# Altium footprint library Connector_PinHeader_2.54mm.PcbLib: 278 footprints (part 2 of 18)
Each footprint in its own frame and in the unit in brackets; x right, y up, seen from the top. Pads: shape width x height; smd on the part's side, far side on the other; paste and mask are expansions set on the pad; w line width, h text height; cw(c..) or ccw(c..) is an arc to the next point about the centre after c.
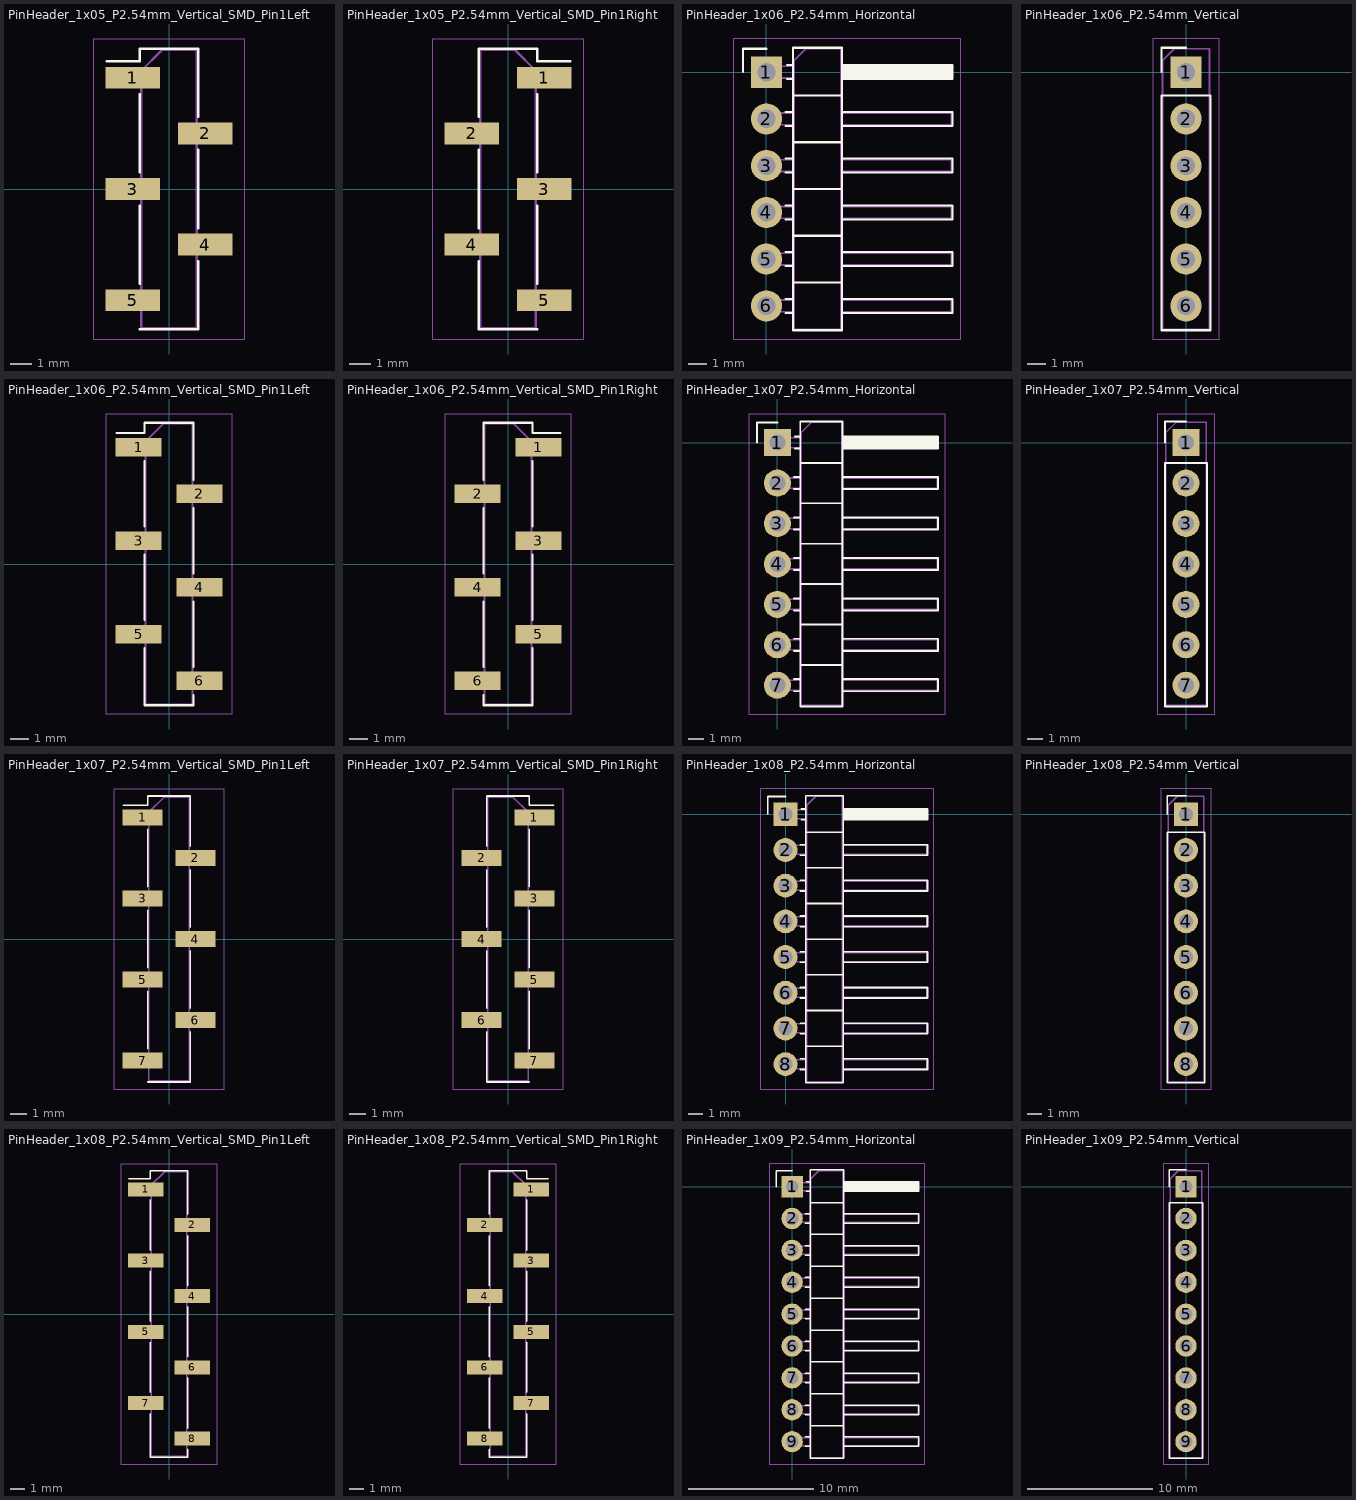
[diagram p1: the footprints below, top view; thin cyan lines are the x and y axes]

## PinHeader_1x05_P2.54mm_Vertical_SMD_Pin1Left [mm]
pads (5):
  rect 2.51x1 smd: 1(-1.655,5.08) 2(1.655,2.54) 3(-1.655,0) 4(1.655,-2.54) 5(-1.655,-5.08)
F.SilkS:
  lines w0.12: -2.85,5.84 -1.33,5.84 -1.33,6.41 1.33,6.41 1.33,3.3 ; -1.33,-6.41 1.33,-6.41 ; -1.33,-4.32 -1.33,-0.76 ; -1.33,0.76 -1.33,4.32 ; 1.33,-5.84 1.33,-6.41 ; 1.33,-3.3 1.33,-6.41 ; 1.33,-1.78 1.33,1.78
F.CrtYd:
  lines w0.05: -3.45,-6.85 -3.45,6.85 3.45,6.85 3.45,-6.85 -3.45,-6.85
F.Fab:
  lines w0.1: -1.27,-5.4 -2.54,-5.4 -2.54,-4.76 -1.27,-4.76 ; -1.27,-0.32 -2.54,-0.32 -2.54,0.32 -1.27,0.32 ; -1.27,4.76 -2.54,4.76 -2.54,5.4 -1.27,5.4 ; 1.27,-2.86 2.54,-2.86 2.54,-2.22 1.27,-2.22 ; 1.27,2.22 2.54,2.22 2.54,2.86 1.27,2.86 ; -1.27,5.4 -0.32,6.35 1.27,6.35 1.27,-6.35 -1.27,-6.35 -1.27,5.4
  text "'.Designator'" at 0.84,-4.047 h1

## PinHeader_1x05_P2.54mm_Vertical_SMD_Pin1Right [mm]
pads (5):
  rect 2.51x1 smd: 1(1.655,5.08) 2(-1.655,2.54) 3(1.655,0) 4(-1.655,-2.54) 5(1.655,-5.08)
F.SilkS:
  lines w0.12: -1.33,-5.84 -1.33,-6.41 ; -1.33,-3.3 -1.33,-6.41 ; -1.33,-1.78 -1.33,1.78 ; -1.33,3.3 -1.33,6.41 1.33,6.41 1.33,5.84 2.85,5.84 ; 1.33,-6.41 -1.33,-6.41 ; 1.33,-4.32 1.33,-0.76 ; 1.33,0.76 1.33,4.32
F.CrtYd:
  lines w0.05: -3.45,-6.85 3.45,-6.85 3.45,6.85 -3.45,6.85 -3.45,-6.85
F.Fab:
  lines w0.1: -1.27,-2.86 -2.54,-2.86 -2.54,-2.22 -1.27,-2.22 ; -1.27,2.22 -2.54,2.22 -2.54,2.86 -1.27,2.86 ; 1.27,-5.4 2.54,-5.4 2.54,-4.76 1.27,-4.76 ; 1.27,-0.32 2.54,-0.32 2.54,0.32 1.27,0.32 ; 1.27,4.76 2.54,4.76 2.54,5.4 1.27,5.4 ; 1.27,5.4 0.32,6.35 -1.27,6.35 -1.27,-6.35 1.27,-6.35 1.27,5.4
  text "'.Designator'" at 0.84,-4.047 h1

## PinHeader_1x06_P2.54mm_Horizontal [mm]
pads (6):
  rect 1.7x1.7 hole 1: 1(0,0)
  rrect100% 1.7x1.7 hole 1: 2(0,-2.54) 3(0,-5.08) 4(0,-7.62) 5(0,-10.16) 6(0,-12.7)
F.SilkS:
  lines w0.12: -1.27,0 -1.27,1.27 0,1.27 ; 1.043,-13.08 1.44,-13.08 ; 1.043,-12.32 1.44,-12.32 ; 1.043,-10.54 1.44,-10.54 ; 1.043,-9.78 1.44,-9.78 ; 1.043,-8 1.44,-8 ; 1.043,-7.24 1.44,-7.24 ; 1.043,-5.46 1.44,-5.46 ; 1.043,-4.7 1.44,-4.7 ; 1.043,-2.92 1.44,-2.92 ; 1.043,-2.16 1.44,-2.16 ; 1.11,-0.38 1.44,-0.38 ; 1.11,0.38 1.44,0.38 ; 1.44,-11.43 4.1,-11.43 ; 1.44,-8.89 4.1,-8.89 ; 1.44,-6.35 4.1,-6.35 ; 1.44,-3.81 4.1,-3.81 ; 1.44,-1.27 4.1,-1.27 ; 4.1,-13.08 10.1,-13.08 10.1,-12.32 4.1,-12.32 ; 4.1,-10.54 10.1,-10.54 10.1,-9.78 4.1,-9.78 ; 4.1,-8 10.1,-8 10.1,-7.24 4.1,-7.24 ; 4.1,-5.46 10.1,-5.46 10.1,-4.7 4.1,-4.7 ; 4.1,-2.92 10.1,-2.92 10.1,-2.16 4.1,-2.16 ; 4.1,-0.38 10.1,-0.38 10.1,0.38 4.1,0.38 ; 4.1,-0.28 10.1,-0.28 ; 4.1,-0.16 10.1,-0.16 ; 4.1,-0.04 10.1,-0.04 ; 4.1,0.08 10.1,0.08 ; 4.1,0.2 10.1,0.2 ; 4.1,0.32 10.1,0.32 ; 1.44,-14.03 1.44,1.33 4.1,1.33 4.1,-14.03 1.44,-14.03
F.CrtYd:
  lines w0.05: -1.8,-14.5 -1.8,1.8 10.55,1.8 10.55,-14.5 -1.8,-14.5
F.Fab:
  lines w0.1: 1.5,-13.02 -0.32,-13.02 -0.32,-12.38 1.5,-12.38 ; 1.5,-10.48 -0.32,-10.48 -0.32,-9.84 1.5,-9.84 ; 1.5,-7.94 -0.32,-7.94 -0.32,-7.3 1.5,-7.3 ; 1.5,-5.4 -0.32,-5.4 -0.32,-4.76 1.5,-4.76 ; 1.5,-2.86 -0.32,-2.86 -0.32,-2.22 1.5,-2.22 ; 1.5,-0.32 -0.32,-0.32 -0.32,0.32 1.5,0.32 ; 4.04,-13.02 10.04,-13.02 10.04,-12.38 4.04,-12.38 ; 4.04,-10.48 10.04,-10.48 10.04,-9.84 4.04,-9.84 ; 4.04,-7.94 10.04,-7.94 10.04,-7.3 4.04,-7.3 ; 4.04,-5.4 10.04,-5.4 10.04,-4.76 4.04,-4.76 ; 4.04,-2.86 10.04,-2.86 10.04,-2.22 4.04,-2.22 ; 4.04,-0.32 10.04,-0.32 10.04,0.32 4.04,0.32 ; 1.5,-13.97 4.04,-13.97 4.04,1.27 2.135,1.27 1.5,0.635 1.5,-13.97
  text "'.Designator'" at 3.61,-10.397 h1

## PinHeader_1x06_P2.54mm_Vertical [mm]
pads (6):
  rect 1.7x1.7 hole 1: 1(0,0)
  rrect100% 1.7x1.7 hole 1: 2(0,-2.54) 3(0,-5.08) 4(0,-7.62) 5(0,-10.16) 6(0,-12.7)
F.SilkS:
  lines w0.12: -1.33,0 -1.33,1.33 0,1.33 ; -1.33,-14.03 -1.33,-1.27 1.33,-1.27 1.33,-14.03 -1.33,-14.03
F.CrtYd:
  lines w0.05: -1.8,-14.5 1.8,-14.5 1.8,1.8 -1.8,1.8 -1.8,-14.5
F.Fab:
  lines w0.1: -1.27,-13.97 1.27,-13.97 1.27,1.27 -0.635,1.27 -1.27,0.635 -1.27,-13.97
  text "'.Designator'" at 0.84,-10.397 h1

## PinHeader_1x06_P2.54mm_Vertical_SMD_Pin1Left [mm]
pads (6):
  rect 2.51x1 smd: 1(-1.655,6.35) 2(1.655,3.81) 3(-1.655,1.27) 4(1.655,-1.27) 5(-1.655,-3.81) 6(1.655,-6.35)
F.SilkS:
  lines w0.12: -2.85,7.11 -1.33,7.11 -1.33,7.68 1.33,7.68 1.33,4.57 ; -1.33,-4.57 -1.33,-7.68 1.33,-7.68 1.33,-7.11 ; -1.33,-3.05 -1.33,0.51 ; -1.33,2.03 -1.33,5.59 ; 1.33,-5.59 1.33,-2.03 ; 1.33,-0.51 1.33,3.05
F.CrtYd:
  lines w0.05: -3.45,-8.15 3.45,-8.15 3.45,8.15 -3.45,8.15 -3.45,-8.15
F.Fab:
  lines w0.1: -1.27,-4.13 -2.54,-4.13 -2.54,-3.49 -1.27,-3.49 ; -1.27,0.95 -2.54,0.95 -2.54,1.59 -1.27,1.59 ; -1.27,6.03 -2.54,6.03 -2.54,6.67 -1.27,6.67 ; 1.27,-6.67 2.54,-6.67 2.54,-6.03 1.27,-6.03 ; 1.27,-1.59 2.54,-1.59 2.54,-0.95 1.27,-0.95 ; 1.27,3.49 2.54,3.49 2.54,4.13 1.27,4.13 ; -1.27,6.67 -1.27,-7.62 1.27,-7.62 1.27,7.62 -0.32,7.62 -1.27,6.67
  text "'.Designator'" at 0.84,-4.047 h1

## PinHeader_1x06_P2.54mm_Vertical_SMD_Pin1Right [mm]
pads (6):
  rect 2.51x1 smd: 1(1.655,6.35) 2(-1.655,3.81) 3(1.655,1.27) 4(-1.655,-1.27) 5(1.655,-3.81) 6(-1.655,-6.35)
F.SilkS:
  lines w0.12: -1.33,-7.11 -1.33,-7.68 1.33,-7.68 1.33,-4.57 ; -1.33,-5.59 -1.33,-2.03 ; -1.33,-0.51 -1.33,3.05 ; -1.33,4.57 -1.33,7.68 1.33,7.68 1.33,7.11 2.85,7.11 ; 1.33,-3.05 1.33,0.51 ; 1.33,2.03 1.33,5.59
F.CrtYd:
  lines w0.05: -3.45,-8.15 -3.45,8.15 3.45,8.15 3.45,-8.15 -3.45,-8.15
F.Fab:
  lines w0.1: -1.27,-6.67 -2.54,-6.67 -2.54,-6.03 -1.27,-6.03 ; -1.27,-1.59 -2.54,-1.59 -2.54,-0.95 -1.27,-0.95 ; -1.27,3.49 -2.54,3.49 -2.54,4.13 -1.27,4.13 ; 1.27,-4.13 2.54,-4.13 2.54,-3.49 1.27,-3.49 ; 1.27,0.95 2.54,0.95 2.54,1.59 1.27,1.59 ; 1.27,6.03 2.54,6.03 2.54,6.67 1.27,6.67 ; 1.27,6.67 1.27,-7.62 -1.27,-7.62 -1.27,7.62 0.32,7.62 1.27,6.67
  text "'.Designator'" at 0.84,-4.047 h1

## PinHeader_1x07_P2.54mm_Horizontal [mm]
pads (7):
  rect 1.7x1.7 hole 1: 1(0,0)
  rrect100% 1.7x1.7 hole 1: 2(0,-2.54) 3(0,-5.08) 4(0,-7.62) 5(0,-10.16) 6(0,-12.7) 7(0,-15.24)
F.SilkS:
  lines w0.12: -1.27,0 -1.27,1.27 0,1.27 ; 1.043,-15.62 1.44,-15.62 ; 1.043,-14.86 1.44,-14.86 ; 1.043,-13.08 1.44,-13.08 ; 1.043,-12.32 1.44,-12.32 ; 1.043,-10.54 1.44,-10.54 ; 1.043,-9.78 1.44,-9.78 ; 1.043,-8 1.44,-8 ; 1.043,-7.24 1.44,-7.24 ; 1.043,-5.46 1.44,-5.46 ; 1.043,-4.7 1.44,-4.7 ; 1.043,-2.92 1.44,-2.92 ; 1.043,-2.16 1.44,-2.16 ; 1.11,-0.38 1.44,-0.38 ; 1.11,0.38 1.44,0.38 ; 1.44,-13.97 4.1,-13.97 ; 1.44,-11.43 4.1,-11.43 ; 1.44,-8.89 4.1,-8.89 ; 1.44,-6.35 4.1,-6.35 ; 1.44,-3.81 4.1,-3.81 ; 1.44,-1.27 4.1,-1.27 ; 4.1,-15.62 10.1,-15.62 10.1,-14.86 4.1,-14.86 ; 4.1,-13.08 10.1,-13.08 10.1,-12.32 4.1,-12.32 ; 4.1,-10.54 10.1,-10.54 10.1,-9.78 4.1,-9.78 ; 4.1,-8 10.1,-8 10.1,-7.24 4.1,-7.24 ; 4.1,-5.46 10.1,-5.46 10.1,-4.7 4.1,-4.7 ; 4.1,-2.92 10.1,-2.92 10.1,-2.16 4.1,-2.16 ; 4.1,-0.38 10.1,-0.38 10.1,0.38 4.1,0.38 ; 4.1,-0.28 10.1,-0.28 ; 4.1,-0.16 10.1,-0.16 ; 4.1,-0.04 10.1,-0.04 ; 4.1,0.08 10.1,0.08 ; 4.1,0.2 10.1,0.2 ; 4.1,0.32 10.1,0.32 ; 1.44,-16.57 1.44,1.33 4.1,1.33 4.1,-16.57 1.44,-16.57
F.CrtYd:
  lines w0.05: -1.8,-17.05 -1.8,1.8 10.55,1.8 10.55,-17.05 -1.8,-17.05
F.Fab:
  lines w0.1: 1.5,-15.56 -0.32,-15.56 -0.32,-14.92 1.5,-14.92 ; 1.5,-13.02 -0.32,-13.02 -0.32,-12.38 1.5,-12.38 ; 1.5,-10.48 -0.32,-10.48 -0.32,-9.84 1.5,-9.84 ; 1.5,-7.94 -0.32,-7.94 -0.32,-7.3 1.5,-7.3 ; 1.5,-5.4 -0.32,-5.4 -0.32,-4.76 1.5,-4.76 ; 1.5,-2.86 -0.32,-2.86 -0.32,-2.22 1.5,-2.22 ; 1.5,-0.32 -0.32,-0.32 -0.32,0.32 1.5,0.32 ; 4.04,-15.56 10.04,-15.56 10.04,-14.92 4.04,-14.92 ; 4.04,-13.02 10.04,-13.02 10.04,-12.38 4.04,-12.38 ; 4.04,-10.48 10.04,-10.48 10.04,-9.84 4.04,-9.84 ; 4.04,-7.94 10.04,-7.94 10.04,-7.3 4.04,-7.3 ; 4.04,-5.4 10.04,-5.4 10.04,-4.76 4.04,-4.76 ; 4.04,-2.86 10.04,-2.86 10.04,-2.22 4.04,-2.22 ; 4.04,-0.32 10.04,-0.32 10.04,0.32 4.04,0.32 ; 1.5,-16.51 1.5,0.635 2.135,1.27 4.04,1.27 4.04,-16.51 1.5,-16.51
  text "'.Designator'" at 3.61,-11.667 h1

## PinHeader_1x07_P2.54mm_Vertical [mm]
pads (7):
  rect 1.7x1.7 hole 1: 1(0,0)
  rrect100% 1.7x1.7 hole 1: 2(0,-2.54) 3(0,-5.08) 4(0,-7.62) 5(0,-10.16) 6(0,-12.7) 7(0,-15.24)
F.SilkS:
  lines w0.12: -1.33,0 -1.33,1.33 0,1.33 ; -1.33,-16.57 -1.33,-1.27 1.33,-1.27 1.33,-16.57 -1.33,-16.57
F.CrtYd:
  lines w0.05: -1.8,-17.05 1.8,-17.05 1.8,1.8 -1.8,1.8 -1.8,-17.05
F.Fab:
  lines w0.1: -1.27,-16.51 1.27,-16.51 1.27,1.27 -0.635,1.27 -1.27,0.635 -1.27,-16.51
  text "'.Designator'" at 0.84,-11.667 h1

## PinHeader_1x07_P2.54mm_Vertical_SMD_Pin1Left [mm]
pads (7):
  rect 2.51x1 smd: 1(-1.655,7.62) 2(1.655,5.08) 3(-1.655,2.54) 4(1.655,0) 5(-1.655,-2.54) 6(1.655,-5.08) 7(-1.655,-7.62)
F.SilkS:
  lines w0.12: -2.85,8.38 -1.33,8.38 -1.33,8.95 1.33,8.95 1.33,5.84 ; -1.33,-8.95 1.33,-8.95 ; -1.33,-6.86 -1.33,-3.3 ; -1.33,-1.78 -1.33,1.78 ; -1.33,3.3 -1.33,6.86 ; 1.33,-8.38 1.33,-8.95 ; 1.33,-5.84 1.33,-8.95 ; 1.33,-4.32 1.33,-0.76 ; 1.33,0.76 1.33,4.32
F.CrtYd:
  lines w0.05: -3.45,-9.4 -3.45,9.4 3.45,9.4 3.45,-9.4 -3.45,-9.4
F.Fab:
  lines w0.1: -1.27,-7.94 -2.54,-7.94 -2.54,-7.3 -1.27,-7.3 ; -1.27,-2.86 -2.54,-2.86 -2.54,-2.22 -1.27,-2.22 ; -1.27,2.22 -2.54,2.22 -2.54,2.86 -1.27,2.86 ; -1.27,7.3 -2.54,7.3 -2.54,7.94 -1.27,7.94 ; 1.27,-5.4 2.54,-5.4 2.54,-4.76 1.27,-4.76 ; 1.27,-0.32 2.54,-0.32 2.54,0.32 1.27,0.32 ; 1.27,4.76 2.54,4.76 2.54,5.4 1.27,5.4 ; -1.27,7.94 -1.27,-8.89 1.27,-8.89 1.27,8.89 -0.32,8.89 -1.27,7.94
  text "'.Designator'" at 0.84,-4.047 h1

## PinHeader_1x07_P2.54mm_Vertical_SMD_Pin1Right [mm]
pads (7):
  rect 2.51x1 smd: 1(1.655,7.62) 2(-1.655,5.08) 3(1.655,2.54) 4(-1.655,0) 5(1.655,-2.54) 6(-1.655,-5.08) 7(1.655,-7.62)
F.SilkS:
  lines w0.12: -1.33,-8.38 -1.33,-8.95 ; -1.33,-5.84 -1.33,-8.95 ; -1.33,-4.32 -1.33,-0.76 ; -1.33,0.76 -1.33,4.32 ; -1.33,5.84 -1.33,8.95 1.33,8.95 1.33,8.38 2.85,8.38 ; 1.33,-8.95 -1.33,-8.95 ; 1.33,-6.86 1.33,-3.3 ; 1.33,-1.78 1.33,1.78 ; 1.33,3.3 1.33,6.86
F.CrtYd:
  lines w0.05: -3.45,-9.4 3.45,-9.4 3.45,9.4 -3.45,9.4 -3.45,-9.4
F.Fab:
  lines w0.1: -1.27,-5.4 -2.54,-5.4 -2.54,-4.76 -1.27,-4.76 ; -1.27,-0.32 -2.54,-0.32 -2.54,0.32 -1.27,0.32 ; -1.27,4.76 -2.54,4.76 -2.54,5.4 -1.27,5.4 ; 1.27,-7.94 2.54,-7.94 2.54,-7.3 1.27,-7.3 ; 1.27,-2.86 2.54,-2.86 2.54,-2.22 1.27,-2.22 ; 1.27,2.22 2.54,2.22 2.54,2.86 1.27,2.86 ; 1.27,7.3 2.54,7.3 2.54,7.94 1.27,7.94 ; 1.27,7.94 1.27,-8.89 -1.27,-8.89 -1.27,8.89 0.32,8.89 1.27,7.94
  text "'.Designator'" at 0.84,-4.047 h1

## PinHeader_1x08_P2.54mm_Horizontal [mm]
pads (8):
  rect 1.7x1.7 hole 1: 1(0,0)
  rrect100% 1.7x1.7 hole 1: 2(0,-2.54) 3(0,-5.08) 4(0,-7.62) 5(0,-10.16) 6(0,-12.7) 7(0,-15.24) 8(0,-17.78)
F.SilkS:
  lines w0.12: -1.27,0 -1.27,1.27 0,1.27 ; 1.043,-18.16 1.44,-18.16 ; 1.043,-17.4 1.44,-17.4 ; 1.043,-15.62 1.44,-15.62 ; 1.043,-14.86 1.44,-14.86 ; 1.043,-13.08 1.44,-13.08 ; 1.043,-12.32 1.44,-12.32 ; 1.043,-10.54 1.44,-10.54 ; 1.043,-9.78 1.44,-9.78 ; 1.043,-8 1.44,-8 ; 1.043,-7.24 1.44,-7.24 ; 1.043,-5.46 1.44,-5.46 ; 1.043,-4.7 1.44,-4.7 ; 1.043,-2.92 1.44,-2.92 ; 1.043,-2.16 1.44,-2.16 ; 1.11,-0.38 1.44,-0.38 ; 1.11,0.38 1.44,0.38 ; 1.44,-16.51 4.1,-16.51 ; 1.44,-13.97 4.1,-13.97 ; 1.44,-11.43 4.1,-11.43 ; 1.44,-8.89 4.1,-8.89 ; 1.44,-6.35 4.1,-6.35 ; 1.44,-3.81 4.1,-3.81 ; 1.44,-1.27 4.1,-1.27 ; 4.1,-18.16 10.1,-18.16 10.1,-17.4 4.1,-17.4 ; 4.1,-15.62 10.1,-15.62 10.1,-14.86 4.1,-14.86 ; 4.1,-13.08 10.1,-13.08 10.1,-12.32 4.1,-12.32 ; 4.1,-10.54 10.1,-10.54 10.1,-9.78 4.1,-9.78 ; 4.1,-8 10.1,-8 10.1,-7.24 4.1,-7.24 ; 4.1,-5.46 10.1,-5.46 10.1,-4.7 4.1,-4.7 ; 4.1,-2.92 10.1,-2.92 10.1,-2.16 4.1,-2.16 ; 4.1,-0.38 10.1,-0.38 10.1,0.38 4.1,0.38 ; 4.1,-0.28 10.1,-0.28 ; 4.1,-0.16 10.1,-0.16 ; 4.1,-0.04 10.1,-0.04 ; 4.1,0.08 10.1,0.08 ; 4.1,0.2 10.1,0.2 ; 4.1,0.32 10.1,0.32 ; 1.44,-19.11 1.44,1.33 4.1,1.33 4.1,-19.11 1.44,-19.11
F.CrtYd:
  lines w0.05: -1.8,-19.55 -1.8,1.8 10.55,1.8 10.55,-19.55 -1.8,-19.55
F.Fab:
  lines w0.1: 1.5,-18.1 -0.32,-18.1 -0.32,-17.46 1.5,-17.46 ; 1.5,-15.56 -0.32,-15.56 -0.32,-14.92 1.5,-14.92 ; 1.5,-13.02 -0.32,-13.02 -0.32,-12.38 1.5,-12.38 ; 1.5,-10.48 -0.32,-10.48 -0.32,-9.84 1.5,-9.84 ; 1.5,-7.94 -0.32,-7.94 -0.32,-7.3 1.5,-7.3 ; 1.5,-5.4 -0.32,-5.4 -0.32,-4.76 1.5,-4.76 ; 1.5,-2.86 -0.32,-2.86 -0.32,-2.22 1.5,-2.22 ; 1.5,-0.32 -0.32,-0.32 -0.32,0.32 1.5,0.32 ; 4.04,-18.1 10.04,-18.1 10.04,-17.46 4.04,-17.46 ; 4.04,-15.56 10.04,-15.56 10.04,-14.92 4.04,-14.92 ; 4.04,-13.02 10.04,-13.02 10.04,-12.38 4.04,-12.38 ; 4.04,-10.48 10.04,-10.48 10.04,-9.84 4.04,-9.84 ; 4.04,-7.94 10.04,-7.94 10.04,-7.3 4.04,-7.3 ; 4.04,-5.4 10.04,-5.4 10.04,-4.76 4.04,-4.76 ; 4.04,-2.86 10.04,-2.86 10.04,-2.22 4.04,-2.22 ; 4.04,-0.32 10.04,-0.32 10.04,0.32 4.04,0.32 ; 1.5,-19.05 1.5,0.635 2.135,1.27 4.04,1.27 4.04,-19.05 1.5,-19.05
  text "'.Designator'" at 3.61,-12.937 h1

## PinHeader_1x08_P2.54mm_Vertical [mm]
pads (8):
  rect 1.7x1.7 hole 1: 1(0,0)
  rrect100% 1.7x1.7 hole 1: 2(0,-2.54) 3(0,-5.08) 4(0,-7.62) 5(0,-10.16) 6(0,-12.7) 7(0,-15.24) 8(0,-17.78)
F.SilkS:
  lines w0.12: -1.33,0 -1.33,1.33 0,1.33 ; -1.33,-19.11 1.33,-19.11 1.33,-1.27 -1.33,-1.27 -1.33,-19.11
F.CrtYd:
  lines w0.05: -1.8,-19.55 1.8,-19.55 1.8,1.8 -1.8,1.8 -1.8,-19.55
F.Fab:
  lines w0.1: -1.27,-19.05 1.27,-19.05 1.27,1.27 -0.635,1.27 -1.27,0.635 -1.27,-19.05
  text "'.Designator'" at 0.84,-12.937 h1

## PinHeader_1x08_P2.54mm_Vertical_SMD_Pin1Left [mm]
pads (8):
  rect 2.51x1 smd: 1(-1.655,8.89) 2(1.655,6.35) 3(-1.655,3.81) 4(1.655,1.27) 5(-1.655,-1.27) 6(1.655,-3.81) 7(-1.655,-6.35) 8(1.655,-8.89)
F.SilkS:
  lines w0.12: -2.85,9.65 -1.33,9.65 -1.33,10.22 1.33,10.22 1.33,7.11 ; -1.33,-7.11 -1.33,-10.22 1.33,-10.22 1.33,-9.65 ; -1.33,-5.59 -1.33,-2.03 ; -1.33,-0.51 -1.33,3.05 ; -1.33,4.57 -1.33,8.13 ; 1.33,-8.13 1.33,-4.57 ; 1.33,-3.05 1.33,0.51 ; 1.33,2.03 1.33,5.59
F.CrtYd:
  lines w0.05: -3.45,-10.7 3.45,-10.7 3.45,10.7 -3.45,10.7 -3.45,-10.7
F.Fab:
  lines w0.1: -1.27,-6.67 -2.54,-6.67 -2.54,-6.03 -1.27,-6.03 ; -1.27,-1.59 -2.54,-1.59 -2.54,-0.95 -1.27,-0.95 ; -1.27,3.49 -2.54,3.49 -2.54,4.13 -1.27,4.13 ; -1.27,8.57 -2.54,8.57 -2.54,9.21 -1.27,9.21 ; 1.27,-9.21 2.54,-9.21 2.54,-8.57 1.27,-8.57 ; 1.27,-4.13 2.54,-4.13 2.54,-3.49 1.27,-3.49 ; 1.27,0.95 2.54,0.95 2.54,1.59 1.27,1.59 ; 1.27,6.03 2.54,6.03 2.54,6.67 1.27,6.67 ; -1.27,9.21 -0.32,10.16 1.27,10.16 1.27,-10.16 -1.27,-10.16 -1.27,9.21
  text "'.Designator'" at 0.84,-4.047 h1

## PinHeader_1x08_P2.54mm_Vertical_SMD_Pin1Right [mm]
pads (8):
  rect 2.51x1 smd: 1(1.655,8.89) 2(-1.655,6.35) 3(1.655,3.81) 4(-1.655,1.27) 5(1.655,-1.27) 6(-1.655,-3.81) 7(1.655,-6.35) 8(-1.655,-8.89)
F.SilkS:
  lines w0.12: -1.33,-9.65 -1.33,-10.22 1.33,-10.22 1.33,-7.11 ; -1.33,-8.13 -1.33,-4.57 ; -1.33,-3.05 -1.33,0.51 ; -1.33,2.03 -1.33,5.59 ; -1.33,7.11 -1.33,10.22 1.33,10.22 1.33,9.65 2.85,9.65 ; 1.33,-5.59 1.33,-2.03 ; 1.33,-0.51 1.33,3.05 ; 1.33,4.57 1.33,8.13
F.CrtYd:
  lines w0.05: -3.45,-10.7 3.45,-10.7 3.45,10.7 -3.45,10.7 -3.45,-10.7
F.Fab:
  lines w0.1: -1.27,-9.21 -2.54,-9.21 -2.54,-8.57 -1.27,-8.57 ; -1.27,-4.13 -2.54,-4.13 -2.54,-3.49 -1.27,-3.49 ; -1.27,0.95 -2.54,0.95 -2.54,1.59 -1.27,1.59 ; -1.27,6.03 -2.54,6.03 -2.54,6.67 -1.27,6.67 ; 1.27,-6.67 2.54,-6.67 2.54,-6.03 1.27,-6.03 ; 1.27,-1.59 2.54,-1.59 2.54,-0.95 1.27,-0.95 ; 1.27,3.49 2.54,3.49 2.54,4.13 1.27,4.13 ; 1.27,8.57 2.54,8.57 2.54,9.21 1.27,9.21 ; 1.27,9.21 1.27,-10.16 -1.27,-10.16 -1.27,10.16 0.32,10.16 1.27,9.21
  text "'.Designator'" at 0.84,-4.047 h1

## PinHeader_1x09_P2.54mm_Horizontal [mm]
pads (9):
  rect 1.7x1.7 hole 1: 1(0,0)
  rrect100% 1.7x1.7 hole 1: 2(0,-2.54) 3(0,-5.08) 4(0,-7.62) 5(0,-10.16) 6(0,-12.7) 7(0,-15.24) 8(0,-17.78) 9(0,-20.32)
F.SilkS:
  lines w0.12: -1.27,0 -1.27,1.27 0,1.27 ; 1.043,-20.7 1.44,-20.7 ; 1.043,-19.94 1.44,-19.94 ; 1.043,-18.16 1.44,-18.16 ; 1.043,-17.4 1.44,-17.4 ; 1.043,-15.62 1.44,-15.62 ; 1.043,-14.86 1.44,-14.86 ; 1.043,-13.08 1.44,-13.08 ; 1.043,-12.32 1.44,-12.32 ; 1.043,-10.54 1.44,-10.54 ; 1.043,-9.78 1.44,-9.78 ; 1.043,-8 1.44,-8 ; 1.043,-7.24 1.44,-7.24 ; 1.043,-5.46 1.44,-5.46 ; 1.043,-4.7 1.44,-4.7 ; 1.043,-2.92 1.44,-2.92 ; 1.043,-2.16 1.44,-2.16 ; 1.11,-0.38 1.44,-0.38 ; 1.11,0.38 1.44,0.38 ; 1.44,-19.05 4.1,-19.05 ; 1.44,-16.51 4.1,-16.51 ; 1.44,-13.97 4.1,-13.97 ; 1.44,-11.43 4.1,-11.43 ; 1.44,-8.89 4.1,-8.89 ; 1.44,-6.35 4.1,-6.35 ; 1.44,-3.81 4.1,-3.81 ; 1.44,-1.27 4.1,-1.27 ; 4.1,-20.7 10.1,-20.7 10.1,-19.94 4.1,-19.94 ; 4.1,-18.16 10.1,-18.16 10.1,-17.4 4.1,-17.4 ; 4.1,-15.62 10.1,-15.62 10.1,-14.86 4.1,-14.86 ; 4.1,-13.08 10.1,-13.08 10.1,-12.32 4.1,-12.32 ; 4.1,-10.54 10.1,-10.54 10.1,-9.78 4.1,-9.78 ; 4.1,-8 10.1,-8 10.1,-7.24 4.1,-7.24 ; 4.1,-5.46 10.1,-5.46 10.1,-4.7 4.1,-4.7 ; 4.1,-2.92 10.1,-2.92 10.1,-2.16 4.1,-2.16 ; 4.1,-0.38 10.1,-0.38 10.1,0.38 4.1,0.38 ; 4.1,-0.28 10.1,-0.28 ; 4.1,-0.16 10.1,-0.16 ; 4.1,-0.04 10.1,-0.04 ; 4.1,0.08 10.1,0.08 ; 4.1,0.2 10.1,0.2 ; 4.1,0.32 10.1,0.32 ; 1.44,-21.65 1.44,1.33 4.1,1.33 4.1,-21.65 1.44,-21.65
F.CrtYd:
  lines w0.05: -1.8,-22.1 10.55,-22.1 10.55,1.8 -1.8,1.8 -1.8,-22.1
F.Fab:
  lines w0.1: 1.5,-20.64 -0.32,-20.64 -0.32,-20 1.5,-20 ; 1.5,-18.1 -0.32,-18.1 -0.32,-17.46 1.5,-17.46 ; 1.5,-15.56 -0.32,-15.56 -0.32,-14.92 1.5,-14.92 ; 1.5,-13.02 -0.32,-13.02 -0.32,-12.38 1.5,-12.38 ; 1.5,-10.48 -0.32,-10.48 -0.32,-9.84 1.5,-9.84 ; 1.5,-7.94 -0.32,-7.94 -0.32,-7.3 1.5,-7.3 ; 1.5,-5.4 -0.32,-5.4 -0.32,-4.76 1.5,-4.76 ; 1.5,-2.86 -0.32,-2.86 -0.32,-2.22 1.5,-2.22 ; 1.5,-0.32 -0.32,-0.32 -0.32,0.32 1.5,0.32 ; 4.04,-20.64 10.04,-20.64 10.04,-20 4.04,-20 ; 4.04,-18.1 10.04,-18.1 10.04,-17.46 4.04,-17.46 ; 4.04,-15.56 10.04,-15.56 10.04,-14.92 4.04,-14.92 ; 4.04,-13.02 10.04,-13.02 10.04,-12.38 4.04,-12.38 ; 4.04,-10.48 10.04,-10.48 10.04,-9.84 4.04,-9.84 ; 4.04,-7.94 10.04,-7.94 10.04,-7.3 4.04,-7.3 ; 4.04,-5.4 10.04,-5.4 10.04,-4.76 4.04,-4.76 ; 4.04,-2.86 10.04,-2.86 10.04,-2.22 4.04,-2.22 ; 4.04,-0.32 10.04,-0.32 10.04,0.32 4.04,0.32 ; 1.5,-21.59 4.04,-21.59 4.04,1.27 2.135,1.27 1.5,0.635 1.5,-21.59
  text "'.Designator'" at 3.61,-14.207 h1

## PinHeader_1x09_P2.54mm_Vertical [mm]
pads (9):
  rect 1.7x1.7 hole 1: 1(0,0)
  rrect100% 1.7x1.7 hole 1: 2(0,-2.54) 3(0,-5.08) 4(0,-7.62) 5(0,-10.16) 6(0,-12.7) 7(0,-15.24) 8(0,-17.78) 9(0,-20.32)
F.SilkS:
  lines w0.12: -1.33,0 -1.33,1.33 0,1.33 ; -1.33,-21.65 -1.33,-1.27 1.33,-1.27 1.33,-21.65 -1.33,-21.65
F.CrtYd:
  lines w0.05: -1.8,-22.1 -1.8,1.8 1.8,1.8 1.8,-22.1 -1.8,-22.1
F.Fab:
  lines w0.1: -1.27,-21.59 -1.27,0.635 -0.635,1.27 1.27,1.27 1.27,-21.59 -1.27,-21.59
  text "'.Designator'" at 0.84,-14.207 h1